# Altium footprint library 7-Connectors-12.PcbLib: 76 footprints (part 4 of 5) (continued)
## SAMTEC_CCH-J-04_OLD [mm] "4 Positions CCH - Bull's Eye Low Cost High Performance SMA Test Point" (continued)
Mechanical 15:
  lines w0.05: -8.505,-3.425 -9.906,-3.425 cw(c-9.906,0) -9.906,3.425 -8.505,3.425 ; -8.501,-3.427 ccw(c-6.604,-2.159) -4.707,-3.427 ; -8.501,3.427 cw(c-6.604,2.159) -4.707,3.427 ; -4.703,-3.425 4.703,-3.425 ; -4.703,3.425 4.703,3.425 ; 4.707,-3.427 ccw(c6.604,-2.159) 8.501,-3.427 ; 4.707,3.427 cw(c6.604,2.159) 8.501,3.427 ; 8.505,-3.425 9.906,-3.425 ccw(c9.906,0) 9.906,3.425 8.505,3.425
Drill Drawing:
  lines w0.1: -7.8,2.9 -9.9,2.9 -9.9,0.8 ; -3.296,2.9 -3.296,0.8 ; 3.3,2.9 3.3,0.8 ; 7.804,2.9 9.904,2.9 9.904,0.8 ; -9.9,0.8 -10.05,0.95 -9.75,0.95 -9.9,0.8 ; -3.296,0.8 -3.446,0.95 -3.146,0.95 -3.296,0.8 ; 3.3,0.8 3.15,0.95 3.45,0.95 3.3,0.8 ; 9.904,0.8 9.754,0.95 10.054,0.95 9.904,0.8
3D body "SAMTEC_CCH-J-04_Part2.stp": height 3.16, standoff -2.62, extent -7.999,-3.55 7.999,3.554
3D body "SAMTEC_CCH-J-04_Part1.stp": height 7.62, standoff 0, extent -13.081,-4.191 13.081,4.191

## SAMTEC_MHDMR-19-02-H-TH-L-TR [mm] "19 Contacts, Pitch 0.4mm, Right Angle, Mini  HDMI High Speed I/O Receptacle"
height 3.2
pads (23):
  rect 0.24x2.05 smd: 1(3.6,0) 2(3.2,0) 3(2.8,0) 4(2.4,0) 5(2,0) 6(1.6,0) 7(1.2,0) 8(0.8,0) 9(0.4,0) 10(0,0) 11(-0.4,0) 12(-0.8,0) 13(-1.2,0) 14(-1.6,0) 15(-2,0) 16(-2.4,0) 17(-2.8,0) 18(-3.2,0) 19(-3.6,0)
  oval 1.32x1.96 hole 0.62 slot 1.26 at 90 deg: SHIELD(-5.425,-5.281) SHIELD(5.423,-5.281)
  oval 1.22x2.14 hole 0.62 slot 1.44 at 90 deg: SHIELD(-5.425,-0.83) SHIELD(5.423,-0.83)
Top Overlay:
  circle w0.25: c4.425,0.5 r0.125
  lines w0.2: -5.6,-6.5 -5.6,-7.33 5.599,-7.33 5.599,-6.5 ; -5.6,-4 -5.6,-2.2 ; -4.6,0.036 -4.199,0.036 ; -3.904,-5.999 ccw(c-3.905,-5.904) -3.82,-5.947 -3.82,-5.937 -3.594,-3.459 cw(c-3.485,-3.474) -3.58,-3.42 cw(c-3.417,-3.562) -3.416,-3.345 -2.814,-3.345 cw(c-2.813,-3.562) -2.65,-3.42 cw(c-2.745,-3.474) -2.636,-3.459 ; -2.636,-3.46 -2.481,-5.473 -2.481,-5.905 ccw(c-2.387,-5.905) -2.4,-5.998 ; 2.322,-5.999 ccw(c2.322,-5.904) 2.407,-5.947 2.407,-5.937 2.633,-3.459 cw(c2.742,-3.474) 2.646,-3.42 cw(c2.81,-3.562) 2.811,-3.345 3.412,-3.345 cw(c3.413,-3.562) 3.577,-3.42 cw(c3.482,-3.474) 3.59,-3.459 ; 3.59,-3.46 3.746,-5.473 3.746,-5.905 ccw(c3.84,-5.905) 3.827,-5.998 ; 4.201,0.036 4.6,0.036 ; 5.599,-4 5.599,-2.2 ; -4.006,-5.897 ccw(c-3.912,-5.905) -3.912,-5.999 -2.316,-5.999 ccw(c-2.316,-5.905) -2.222,-5.897 -2.468,-3.093 ccw(c-2.57,-3.102) -2.57,-2.999 -3.658,-2.999 ccw(c-3.658,-3.102) -3.761,-3.093 -4.006,-5.897 ; 2.221,-5.897 ccw(c2.314,-5.905) 2.314,-5.999 3.911,-5.999 ccw(c3.911,-5.905) 4.004,-5.897 3.759,-3.093 ccw(c3.657,-3.102) 3.657,-2.999 2.568,-2.999 ccw(c2.568,-3.102) 2.466,-3.093 2.221,-5.897
Mechanical 7:
  lines w0.1: -3.699,-0.719 -3.699,-0.71
Mechanical 8:
  lines w0.1: -5.925,-5.68 -5.425,-5.68 -4.925,-5.68 ; -5.925,-5.281 -5.425,-5.281 -4.925,-5.281 ; -5.925,-4.88 -5.425,-4.88 -4.925,-4.88 ; -5.925,-1.28 -5.425,-1.28 -4.925,-1.28 ; -5.925,-0.83 -5.425,-0.83 -4.925,-0.83 ; -5.925,-0.38 -5.425,-0.38 -4.925,-0.38 ; -5.425,-6.18 -5.425,-4.38 ; -5.425,-1.78 -5.425,0.12 ; -4.1,0 -3.6,0 ; -3.6,-0.5 -3.6,0 ; -3.6,0.5 -3.6,0 ; -3.2,-0.5 -3.2,0 ; -3.2,0.5 -3.2,0 ; -2.8,-0.5 -2.8,0 ; -2.8,0.5 -2.8,0 ; -2.4,-0.5 -2.4,0 ; -2.4,0.5 -2.4,0 ; -2,-0.5 -2,0 ; -2,0.5 -2,0 ; -1.6,-0.5 -1.6,0 ; -1.6,0.5 -1.6,0 ; -1.2,-0.5 -1.2,0 ; -1.2,0.5 -1.2,0 ; -0.8,-0.5 -0.8,0 ; -0.8,0.5 -0.8,0 ; -0.4,-0.5 -0.4,0 ; -0.4,0.5 -0.4,0 ; 0,-0.5 0,0 ; 0,0.5 0,0 ; 0.4,-0.5 0.4,0 ; 0.4,0.5 0.4,0 ; 0.8,-0.5 0.8,0 ; 0.8,0.5 0.8,0 ; 1.2,-0.5 1.2,0 ; 1.2,0.5 1.2,0 ; 1.6,-0.5 1.6,0 ; 1.6,0.5 1.6,0 ; 2,-0.5 2,0 ; 2,0.5 2,0 ; 2.4,-0.5 2.4,0 ; 2.4,0.5 2.4,0 ; 2.8,-0.5 2.8,0 ; 2.8,0.5 2.8,0 ; 3.2,-0.5 3.2,0 ; 3.2,0.5 3.2,0 ; 3.6,-0.5 3.6,0 ; 3.6,0.5 3.6,0 ; 4.1,0 3.6,0 ; 4.923,-5.281 5.423,-5.281 5.923,-5.281 ; 4.923,-0.83 5.423,-0.83 5.923,-0.83 ; 4.925,-5.68 5.425,-5.68 5.925,-5.68 ; 4.925,-4.88 5.425,-4.88 5.925,-4.88 ; 4.925,-1.28 5.425,-1.28 5.925,-1.28 ; 4.925,-0.38 5.425,-0.38 5.925,-0.38 ; 5.425,-6.18 5.425,-4.38 ; 5.425,-1.78 5.425,0.12 ; -3.6,0 -3.2,0 ; -3.2,0 -2.8,0 ; -2.8,0 -2.4,0 ; -2.4,0 -2,0 ; -2,0 -1.6,0 ; -1.6,0 -1.2,0 ; -1.2,0 -0.8,0 ; -0.8,0 -0.4,0 ; -0.4,0 0,0 ; 0,0 0.4,0 ; 0.4,0 0.8,0 ; 0.8,0 1.2,0 ; 1.2,0 1.6,0 ; 1.6,0 2,0 ; 2,0 2.4,0 ; 2.4,0 2.8,0 ; 2.8,0 3.2,0 ; 3.2,0 3.6,0
Mechanical 14:
  circle w0.1: c4.425,0.5 r0.2
  lines w0.1: -5.345,-0.33 -5.345,0.036 5.343,0.036 5.343,-0.33 ; -3.904,-5.999 ccw(c-3.905,-5.904) -3.82,-5.947 -3.82,-5.937 -3.594,-3.459 cw(c-3.485,-3.474) -3.58,-3.42 cw(c-3.417,-3.562) -3.416,-3.345 -2.814,-3.345 cw(c-2.813,-3.562) -2.65,-3.42 cw(c-2.745,-3.474) -2.636,-3.459 ; -3.699,0.036 -3.699,0.871 -3.499,0.871 -3.499,0.036 ; -3.449,-0.33 -3.449,-1.031 ccw(c-3.149,-1.031) -2.849,-1.031 -2.849,-0.33 ; -3.299,0.036 -3.299,0.871 -3.099,0.871 -3.099,0.036 ; -2.899,0.036 -2.899,0.871 -2.699,0.871 -2.699,0.036 ; -2.636,-3.46 -2.481,-5.473 -2.481,-5.905 ccw(c-2.387,-5.905) -2.4,-5.998 ; -2.499,0.036 -2.499,0.871 -2.299,0.871 -2.299,0.036 ; -2.099,0.036 -2.099,0.871 -1.899,0.871 -1.899,0.036 ; -1.699,0.036 -1.699,0.871 -1.499,0.871 -1.499,0.036 ; -1.299,0.036 -1.299,0.871 -1.099,0.871 -1.099,0.036 ; -0.899,0.036 -0.899,0.871 -0.699,0.871 -0.699,0.036 ; -0.501,-0.783 0.499,-0.783 ; -0.501,-0.651 0.499,-0.651 ; -0.499,-0.614 -0.499,-1.531 0.499,-1.531 0.501,-0.614 ; -0.499,0.036 -0.499,0.871 -0.299,0.871 -0.299,0.036 ; -0.099,0.036 -0.099,0.871 0.101,0.871 0.101,0.036 ; 0.301,0.036 0.301,0.871 0.501,0.871 0.501,0.036 ; 0.701,0.036 0.701,0.871 0.901,0.871 0.901,0.036 ; 1.101,0.036 1.101,0.871 1.301,0.871 1.301,0.036 ; 1.501,0.036 1.501,0.871 1.701,0.871 1.701,0.036 ; 1.901,0.036 1.901,0.871 2.101,0.871 2.101,0.036 ; 2.301,0.036 2.301,0.871 2.501,0.871 2.501,0.036 ; 2.322,-5.999 ccw(c2.322,-5.904) 2.407,-5.947 2.407,-5.937 2.633,-3.459 cw(c2.742,-3.474) 2.646,-3.42 cw(c2.81,-3.562) 2.811,-3.345 3.412,-3.345 cw(c3.413,-3.562) 3.577,-3.42 cw(c3.482,-3.474) 3.59,-3.459 ; 2.701,0.036 2.701,0.871 2.901,0.871 2.901,0.036 ; 2.848,-0.33 2.848,-1.031 ccw(c3.148,-1.031) 3.447,-1.031 3.447,-0.33 ; 3.101,0.036 3.101,0.871 3.301,0.871 3.301,0.036 ; 3.501,0.036 3.501,0.871 3.701,0.871 3.701,0.036 ; 3.59,-3.46 3.746,-5.473 3.746,-5.905 ccw(c3.84,-5.905) 3.827,-5.998 ; -5.6,-7.33 5.599,-7.33 5.599,-0.33 -5.6,-0.33 -5.6,-7.33 ; -5.576,-5.755 -4.598,-5.755 -4.598,-4.104 -5.576,-4.104 -5.576,-5.755 ; -4.006,-5.897 ccw(c-3.912,-5.905) -3.912,-5.999 -2.316,-5.999 ccw(c-2.316,-5.905) -2.222,-5.897 -2.468,-3.093 ccw(c-2.57,-3.102) -2.57,-2.999 -3.658,-2.999 ccw(c-3.658,-3.102) -3.761,-3.093 -4.006,-5.897 ; 2.221,-5.897 ccw(c2.314,-5.905) 2.314,-5.999 3.911,-5.999 ccw(c3.911,-5.905) 4.004,-5.897 3.759,-3.093 ccw(c3.657,-3.102) 3.657,-2.999 2.568,-2.999 ccw(c2.568,-3.102) 2.466,-3.093 2.221,-5.897 ; 4.597,-5.755 5.575,-5.755 5.575,-4.104 4.597,-4.104 4.597,-5.755
3D body "SAMTEC_MHDMR-19-02-H-TH-L-TR.stp": height 3.28, standoff -0.92, extent -5.74,-7.33 5.738,0.871

## SAMTEC_USB3-B-S-F-TH [mm] "Right Angle, Shielded USB 3.0 Standard B Receptacle"
height 12.9
pads (11):
  round 1.6 hole 0.9: 1(1.25,1) 2(-1.25,1) 3(-1.25,-1) 4(1.25,-1)
  round 1.4 hole 0.7: 5(-4.25,3) 6(-2.5,3) 7(0,3) 8(2.5,3) 9(4.25,3)
  round 3 hole 2.3: SH(-6.02,-3.71) SH(6.02,-3.71)
Top Overlay:
  lines w0.2: -6,-5.61 -6,-13.415 ; -6,-1.81 -6,4.235 6,4.235 6,-1.81 ; -6,3.935 -4.829,3.935 ; -5.7,-13.415 ccw(c-5.4,-13.415) -5.4,-13.715 -3.45,-13.715 ; -5.5,3.935 -5.5,4.235 ; -5.4,-13.415 -5.4,-5.506 ; -5.4,-1.914 -5.4,3.935 ; -5.2,-13.715 -5.2,-13.415 -6,-13.415 ; -2.9,-14.015 -5.4,-14.015 cw(c-5.4,-13.415) -6,-13.415 ; -2.9,-13.953 ccw(c-2.619,-13.932) -2.6,-14.213 ; -2.9,-13.79 2.9,-13.785 ; -2.9,-13.714 -3.45,-13.715 ; -2.9,-13.635 2.9,-13.635 ; 2.6,-14.213 ccw(c2.619,-13.932) 2.9,-13.953 ; 2.9,-14.015 5.4,-14.015 ccw(c5.4,-13.415) 6,-13.415 ; 2.9,-13.714 3.45,-13.715 ; 4.829,3.935 6,3.935 ; 5.19,-13.715 5.2,-13.415 6,-13.415 ; 5.4,-13.415 5.4,-5.506 ; 5.4,-1.914 5.4,3.935 ; 5.5,3.935 5.5,4.235 ; 5.7,-13.415 cw(c5.4,-13.415) 5.4,-13.715 3.45,-13.715 ; 6,-5.61 6,-13.415 ; -3.45,-13.715 ccw(c-3.45,-13.565) -3.3,-13.565 cw(c-3.15,-13.565) -3.15,-13.415 -3.05,-13.415 cw(c-3.05,-13.565) -2.9,-13.565 -2.9,-14.103 ccw(c-2.619,-14.082) -2.6,-14.363 ; -2.6,-14.363 2.6,-14.363 ; -2.6,-14.363 -2.6,-14.213 ; -2.6,-14.213 2.6,-14.214 2.6,-14.363 ; 2.6,-14.363 ccw(c2.619,-14.082) 2.9,-14.103 2.9,-13.953 ; 2.9,-13.953 2.9,-13.565 cw(c3.05,-13.565) 3.05,-13.415 3.15,-13.415 cw(c3.15,-13.565) 3.3,-13.565 ccw(c3.45,-13.565) 3.45,-13.715
Mechanical 8:
  lines w0.1: -6.52,-3.71 -6.02,-3.71 ; -6.02,-4.21 -6.02,-3.71 ; -6.02,-3.21 -6.02,-3.71 ; -5.52,-3.71 -6.02,-3.71 ; -4.75,3 -4.25,3 ; -4.25,2.5 -4.25,3 ; -4.25,3.5 -4.25,3 ; -3.75,3 -4.25,3 ; -3,3 -2.5,3 ; -2.5,2.5 -2.5,3 ; -2.5,3.5 -2.5,3 ; -2,3 -2.5,3 ; -1.75,-1 -1.25,-1 ; -1.75,1 -1.25,1 ; -1.25,-1.5 -1.25,-1 ; -1.25,-0.5 -1.25,-1 ; -1.25,0.5 -1.25,1 ; -1.25,1.5 -1.25,1 ; -0.75,-1 -1.25,-1 ; -0.75,1 -1.25,1 ; -0.5,0 0,0 ; -0.5,3 0,3 ; 0,-0.5 0,0 ; 0,0.5 0,0 ; 0,2.5 0,3 ; 0,3.5 0,3 ; 0.5,0 0,0 ; 0.5,3 0,3 ; 0.75,-1 1.25,-1 ; 0.75,1 1.25,1 ; 1.25,-1.5 1.25,-1 ; 1.25,-0.5 1.25,-1 ; 1.25,0.5 1.25,1 ; 1.25,1.5 1.25,1 ; 1.75,-1 1.25,-1 ; 1.75,1 1.25,1 ; 2,3 2.5,3 ; 2.5,2.5 2.5,3 ; 2.5,3.5 2.5,3 ; 3,3 2.5,3 ; 3.75,3 4.25,3 ; 4.25,2.5 4.25,3 ; 4.25,3.5 4.25,3 ; 4.75,3 4.25,3 ; 5.52,-3.71 6.02,-3.71 ; 6.02,-4.21 6.02,-3.71 ; 6.02,-3.21 6.02,-3.71 ; 6.52,-3.71 6.02,-3.71
Mechanical 14:
  lines w0.1: -6,-5.015 ccw(c-6.093,-5.018) -6.026,-4.953 -7.201,-4.348 -7.252,-4.326 -7.252,-3.104 -7.201,-3.082 ; -6,-2.415 cw(c-6.093,-2.412) -6.026,-2.477 ; -6,3.935 6,3.935 ; -5.7,-13.415 ccw(c-5.4,-13.415) -5.4,-13.715 -3.45,-13.715 ; -5.5,3.935 -5.5,4.235 ; -5.4,-13.415 -5.4,3.935 ; -5.2,-13.715 -5.2,-13.415 -6,-13.415 ; -3.8,3.935 -3.8,4.235 ; -3.5,3.935 -3.5,4.235 ; -2.9,-14.015 -5.4,-14.015 cw(c-5.4,-13.415) -6,-13.415 ; -2.9,-13.953 ccw(c-2.619,-13.932) -2.6,-14.213 ; -2.9,-13.79 2.9,-13.785 ; -2.9,-13.714 -3.45,-13.715 ; -2.9,-13.635 2.9,-13.635 ; 2.6,-14.213 ccw(c2.619,-13.932) 2.9,-13.953 ; 2.9,-14.015 5.4,-14.015 ccw(c5.4,-13.415) 6,-13.415 ; 2.9,-13.714 3.45,-13.715 ; 3.5,3.935 3.5,4.235 ; 3.8,3.935 3.8,4.235 ; 5.19,-13.715 5.2,-13.415 6,-13.415 ; 5.4,-13.415 5.4,3.935 ; 5.5,3.935 5.5,4.235 ; 5.7,-13.415 cw(c5.4,-13.415) 5.4,-13.715 3.45,-13.715 ; 6,-5.015 cw(c6.093,-5.018) 6.026,-4.953 7.201,-4.348 7.252,-4.326 7.252,-3.104 7.201,-3.082 ; 6,-2.415 ccw(c6.093,-2.412) 6.026,-2.477 ; -7.201,-3.082 -6.026,-2.477 ; -7.201,-3.082 -6.026,-2.477 ; -6,-13.415 -6,4.235 6,4.235 6,-13.415 ; -3.45,-13.715 ccw(c-3.45,-13.565) -3.3,-13.565 cw(c-3.15,-13.565) -3.15,-13.415 -3.05,-13.415 cw(c-3.05,-13.565) -2.9,-13.565 -2.9,-14.103 ccw(c-2.619,-14.082) -2.6,-14.363 ; -2.6,-14.363 2.6,-14.363 ; -2.6,-14.363 -2.6,-14.213 ; -2.6,-14.213 2.6,-14.214 2.6,-14.363 ; 2.6,-14.363 ccw(c2.619,-14.082) 2.9,-14.103 2.9,-13.953 ; 2.9,-13.953 2.9,-13.565 cw(c3.05,-13.565) 3.05,-13.415 3.15,-13.415 cw(c3.15,-13.565) 3.3,-13.565 ccw(c3.45,-13.565) 3.45,-13.715 ; 6.026,-2.477 7.201,-3.082 ; 6.026,-2.477 7.201,-3.082
3D body "SAMTEC_USB3-B-S-F-TH.stp": height 13.19, standoff -3.04, extent -7.252,-14.363 7.252,4.235

## TP [mm]
height 11.7
pads (1):
  round 2 smd mask+1: W(0,0)
Top Overlay:
  circle w0.254: c0,0 r2.195
Keep-Out Layer:
  circle w0.025: c0,0 r2.017
3D body "1_016-1_016-3_tp.stp": height 0.02, standoff 0, extent -1.5,-1.5 1.5,1.5

## TYCO_5-6605308-1 [mm] "1 Port, Yellow/Green LEDs, RJ45 10/100Base-T Ethernet, Mag45 Connector Module With Integrated Magnetics"
height 15.24
pads (16):
  oct 1.6x1.6 hole 0.9: 1(-4.445,-1.27)
  round 1.6 hole 0.9: 2(-3.175,1.27) 3(-1.905,-1.27) 4(-0.635,1.27) 5(0.635,-1.27) 6(1.905,1.27) 7(3.175,-1.27) 8(4.445,1.27)
  round 2.3 hole 1.6: 9(-7.747,-4.572) 10(7.747,-4.572)
  round 1.7 hole 1: D1(-6.325,-12.522) D2(-3.785,-10.998) D3(6.325,-10.998) D4(3.785,-12.522)
  round 1 hole 3.2 unplated mask+1.1: M1(-5.715,-7.62) M2(5.715,-7.62)
Top Overlay:
  lines w0.2: -8.191,-6.057 -8.191,-12.07 -7.937,-12.07 -7.937,-18.42 7.938,-18.42 7.938,-12.07 8.192,-12.07 8.192,-6.057 ; -7.937,-18.352 cw(c-7.683,-17.912) -8.046,-18.268 cw(c-5.783,-16.047) -7.937,-13.721 ; -7.937,-18.013 cw(c-5.783,-16.047) -7.937,-14.082 ; -7.175,-3.053 -7.175,2.408 ; -7.175,-0.64 -7.429,-0.64 -7.429,2.408 7.43,2.408 7.43,-0.64 7.176,-0.64 ; -6.871,-13.647 -6.871,-18.166 -4.077,-18.166 -4.077,-12.705 -4.458,-12.705 -4.458,-17.607 -6.49,-17.607 -6.49,-13.761 ; -6.49,-13.88 -4.458,-13.88 ; -6.242,-18.43 ccw(c-5.296,-15.855) -4.35,-18.43 ; 4.077,-13.738 4.077,-18.166 6.871,-18.166 6.871,-12.705 6.49,-12.705 6.49,-17.607 4.458,-17.607 4.458,-13.576 ; 4.35,-18.43 ccw(c5.296,-15.855) 6.242,-18.43 ; 4.458,-13.88 6.49,-13.88 ; 7.176,-3.053 7.176,2.408 ; 7.938,-18.352 ccw(c7.684,-17.912) 8.046,-18.268 ccw(c5.783,-16.047) 7.938,-13.721 ; 7.938,-18.013 ccw(c5.783,-16.047) 7.938,-14.082
Mechanical 8:
  circle w0.1: c-7.747,-4.572 r0.8
  circle w0.1: c7.747,-4.572 r0.8
  circle w0.1: c-5.715,-7.62 r1.6
  circle w0.1: c5.715,-7.62 r1.6
  circle w0.1: c-6.325,-12.522 r0.5
  circle w0.1: c-3.785,-10.998 r0.5
  circle w0.1: c3.785,-12.522 r0.5
  circle w0.1: c6.325,-10.998 r0.5
  circle w0.1: c-3.175,1.27 r0.45
  circle w0.1: c-4.445,-1.27 r0.45
  circle w0.1: c-1.905,-1.27 r0.45
  circle w0.1: c0.635,-1.27 r0.45
  circle w0.1: c3.175,-1.27 r0.45
  circle w0.1: c4.445,1.27 r0.45
  circle w0.1: c1.905,1.27 r0.45
  circle w0.1: c-0.635,1.27 r0.45
  lines w0.1: -9.2,-14.529 9.2,-14.529 ; -8.247,-4.572 -7.747,-4.572 ; -7.747,-5.072 -7.747,-4.572 ; -7.747,-4.072 -7.747,-4.572 ; -7.247,-4.572 -7.747,-4.572 ; -6.825,-12.522 -6.325,-12.522 ; -6.325,-13.022 -6.325,-12.522 ; -6.325,-12.022 -6.325,-12.522 ; -6.215,-7.62 -5.715,-7.62 ; -5.825,-12.522 -6.325,-12.522 ; -5.715,-8.12 -5.715,-7.62 ; -5.715,-7.12 -5.715,-7.62 ; -5.215,-7.62 -5.715,-7.62 ; -4.945,-1.27 -4.445,-1.27 ; -4.445,-1.77 -4.445,-1.27 ; -4.445,-0.77 -4.445,-1.27 ; -4.285,-10.998 -3.785,-10.998 ; -3.945,-1.27 -4.445,-1.27 ; -3.785,-11.498 -3.785,-10.998 ; -3.785,-10.498 -3.785,-10.998 ; -3.675,1.27 -3.175,1.27 ; -3.285,-10.998 -3.785,-10.998 ; -3.175,0.77 -3.175,1.27 ; -3.175,1.77 -3.175,1.27 ; -2.675,1.27 -3.175,1.27 ; -2.405,-1.27 -1.905,-1.27 ; -1.905,-1.77 -1.905,-1.27 ; -1.905,-0.77 -1.905,-1.27 ; -1.405,-1.27 -1.905,-1.27 ; -1.135,1.27 -0.635,1.27 ; -0.635,0.77 -0.635,1.27 ; -0.635,1.77 -0.635,1.27 ; -0.5,0 0,0 ; -0.135,1.27 -0.635,1.27 ; 0,-0.5 0,0 ; 0,0.5 0,0 ; 0.135,-1.27 0.635,-1.27 ; 0.5,0 0,0 ; 0.635,-1.77 0.635,-1.27 ; 0.635,-0.77 0.635,-1.27 ; 1.135,-1.27 0.635,-1.27 ; 1.405,1.27 1.905,1.27 ; 1.905,0.77 1.905,1.27 ; 1.905,1.77 1.905,1.27 ; 2.405,1.27 1.905,1.27 ; 2.675,-1.27 3.175,-1.27 ; 3.175,-1.77 3.175,-1.27 ; 3.175,-0.77 3.175,-1.27 ; 3.285,-12.522 3.785,-12.522 ; 3.675,-1.27 3.175,-1.27 ; 3.785,-13.022 3.785,-12.522 ; 3.785,-12.022 3.785,-12.522 ; 3.945,1.27 4.445,1.27 ; 4.285,-12.522 3.785,-12.522 ; 4.445,0.77 4.445,1.27 ; 4.445,1.77 4.445,1.27 ; 4.945,1.27 4.445,1.27 ; 5.215,-7.62 5.715,-7.62 ; 5.715,-8.12 5.715,-7.62 ; 5.715,-7.12 5.715,-7.62 ; 5.825,-10.998 6.325,-10.998 ; 6.215,-7.62 5.715,-7.62 ; 6.325,-11.498 6.325,-10.998 ; 6.325,-10.498 6.325,-10.998 ; 6.825,-10.998 6.325,-10.998 ; 7.247,-4.572 7.747,-4.572 ; 7.747,-5.072 7.747,-4.572 ; 7.747,-4.072 7.747,-4.572 ; 8.247,-4.572 7.747,-4.572
Mechanical 14:
  lines w0.1: -7.937,-18.352 cw(c-7.683,-17.912) -8.046,-18.268 cw(c-5.783,-16.047) -7.937,-13.721 ; -7.937,-18.013 cw(c-5.783,-16.047) -7.937,-14.082 ; -7.175,-0.64 -7.429,-0.64 -7.429,2.408 7.43,2.408 7.43,-0.64 7.176,-0.64 ; -7.175,2.408 -7.175,-3.053 -7.937,-3.053 -7.937,-4.45 -8.191,-4.45 -8.191,-12.07 -7.937,-12.07 -7.937,-18.42 7.938,-18.42 7.938,-12.07 8.192,-12.07 8.192,-4.45 7.938,-4.45 7.938,-3.053 7.176,-3.053 7.176,2.408 ; -6.49,-13.88 -4.458,-13.88 ; -6.242,-18.43 ccw(c-5.296,-15.855) -4.35,-18.43 ; 4.35,-18.43 ccw(c5.296,-15.855) 6.242,-18.43 ; 4.458,-13.88 6.49,-13.88 ; 7.938,-18.352 ccw(c7.684,-17.912) 8.046,-18.268 ccw(c5.783,-16.047) 7.938,-13.721 ; 7.938,-18.013 ccw(c5.783,-16.047) 7.938,-14.082 ; -6.871,-18.166 -4.077,-18.166 -4.077,-12.705 -4.458,-12.705 -4.458,-17.607 -6.49,-17.607 -6.49,-12.705 -6.871,-12.705 -6.871,-18.166 ; 4.077,-18.166 6.871,-18.166 6.871,-12.705 6.49,-12.705 6.49,-17.607 4.458,-17.607 4.458,-12.705 4.077,-12.705 4.077,-18.166
3D body "TYCO_5-6605308-1.stp": height 14.99, standoff -3.68, extent -8.952,-18.598 8.953,2.408
3D body "m20-254via.stp": height 0.1, standoff -1.82, extent -5.295,-2.12 -3.595,-0.42
3D body "m20-254via.stp": height 0.1, standoff -1.82, extent -2.755,-2.12 -1.055,-0.42
3D body "m20-254via.stp": height 0.1, standoff -1.82, extent -0.215,-2.12 1.485,-0.42
3D body "m20-254via.stp": height 0.1, standoff -1.82, extent 2.325,-2.12 4.025,-0.42
3D body "m20-254via.stp": height 0.1, standoff -1.82, extent 3.595,0.42 5.295,2.12
3D body "m20-254via.stp": height 0.1, standoff -1.82, extent 1.055,0.42 2.755,2.12
3D body "m20-254via.stp": height 0.1, standoff -1.82, extent -1.485,0.42 0.215,2.12
3D body "m20-254via.stp": height 0.1, standoff -1.82, extent -4.025,0.42 -2.325,2.12
3D body "m20-254via.stp": height 0.1, standoff -1.82, extent -7.174,-13.372 -5.474,-11.672
3D body "m20-254via.stp": height 0.1, standoff -1.82, extent -4.635,-11.823 -2.934,-10.123
3D body "m20-254via.stp": height 0.1, standoff -1.82, extent 2.935,-13.372 4.635,-11.672
3D body "m20-254via.stp": height 0.1, standoff -1.82, extent 5.475,-11.848 7.175,-10.148
3D body "rj45-gdvia.stp": height 0.1, standoff -1.85, extent -8.897,-5.722 -6.597,-3.422
3D body "rj45-gdvia.stp": height 0.1, standoff -1.85, extent 6.597,-5.722 8.897,-3.422

## TYCO_1367073-1 [mm] "20 Position, Pitch 0.8mm SFP Receptacle (Small Form-factor Pluggable)"
height 5.4
pads (22):
  rect 2x0.5 smd: 1(-4.1,3.395) 2(-4.1,2.595) 3(-4.1,1.795) 4(-4.1,0.995) 5(-4.1,0.195) 6(-4.1,-0.605) 7(-4.1,-1.405) 8(-4.1,-2.205) 9(-4.1,-3.005) 10(-4.1,-3.805) 11(4.1,-3.405) 12(4.1,-2.605) 13(4.1,-1.805) 14(4.1,-1.005) 15(4.1,-0.205) 16(4.1,0.595) 17(4.1,1.395) 18(4.1,2.195) 19(4.1,2.995) 20(4.1,3.795)
  round 1 hole 1.55 unplated mask+0.28: MTG1(0,4.795) MTG2(0,-4.805)
Top Layer keep-out:
  lines w0.1: -4.34,-5.755 -4.34,-4.395 -2.88,-4.395 -2.88,-3.855 2.88,-3.855 2.88,-3.995 3.94,-3.995 3.94,-4.805 3.94,-5.755 -4.34,-5.755 ; -4.34,3.985 -4.34,5.745 3.94,5.745 3.94,4.385 2.88,4.385 2.88,3.845 -2.88,3.845 -2.88,3.985 -4.34,3.985
Top Overlay:
  circle w0.25: c-4.955,4.318 r0.125
  lines w0.2: -40,-7.774 -42.4,-7.774 -42.4,7.774 -40,7.774 ; -4,-4.505 -4,-5.505 -0.944,-5.505 ; -3.7,-5.505 -3.7,-4.505 ; -3.7,-5.305 -2.98,-4.705 -2.98,-4.505 ; -3.7,4.045 -3.7,5.495 ; -3.7,4.095 -4,4.095 -4,5.495 -0.944,5.495 ; -3.7,4.432 -2.98,4.495 ; -3.7,5.295 -2.98,4.695 -2.98,4.045 ; -3.223,4.045 -3.223,4.474 ; 0.944,-5.505 2.9,-5.505 3.7,-4.705 3.7,-4.055 ; 0.944,5.495 3.7,5.495 3.7,4.445 ; 5.5,-7.774 6.3,-7.774 6.3,-5.777 ; 5.5,7.774 6.3,7.774 6.3,5.777
Mechanical 8:
  circle w0.1: c0,-4.805 r0.775
  circle w0.1: c0,4.795 r0.775
  lines w0.1: -4.6,-3.805 -4.1,-3.805 -3.6,-3.805 ; -4.6,-3.005 -4.1,-3.005 -3.6,-3.005 ; -4.6,-2.205 -4.1,-2.205 -3.6,-2.205 ; -4.6,-1.405 -4.1,-1.405 -3.6,-1.405 ; -4.6,-0.605 -4.1,-0.605 -3.6,-0.605 ; -4.6,0.195 -4.1,0.195 -3.6,0.195 ; -4.6,0.995 -4.1,0.995 -3.6,0.995 ; -4.6,1.795 -4.1,1.795 -3.6,1.795 ; -4.6,2.595 -4.1,2.595 -3.6,2.595 ; -4.6,3.395 -4.1,3.395 -3.6,3.395 ; -4.1,-4.305 -4.1,3.895 ; -0.5,-4.805 0,-4.805 ; -0.5,0 0,0 ; -0.5,4.795 0,4.795 ; 0,-5.305 0,-4.805 ; 0,-4.305 0,-4.805 ; 0,-0.5 0,0 ; 0,0.5 0,0 ; 0,4.295 0,4.795 ; 0,5.295 0,4.795 ; 0.5,-4.805 0,-4.805 ; 0.5,0 0,0 ; 0.5,4.795 0,4.795 ; 3.6,-3.405 4.1,-3.405 4.6,-3.405 ; 3.6,-2.605 4.1,-2.605 4.6,-2.605 ; 3.6,-1.805 4.1,-1.805 4.6,-1.805 ; 3.6,-1.005 4.1,-1.005 4.6,-1.005 ; 3.6,-0.205 4.1,-0.205 4.6,-0.205 ; 3.6,0.595 4.1,0.595 4.6,0.595 ; 3.6,1.395 4.1,1.395 4.6,1.395 ; 3.6,2.195 4.1,2.195 4.6,2.195 ; 3.6,2.995 4.1,2.995 4.6,2.995 ; 3.6,3.795 4.1,3.795 4.6,3.795 ; 4.1,-3.905 4.1,4.295
Mechanical 14:
  circle w0.1: c-4.955,4.318 r0.125
  lines w0.1: -3.7,-5.505 -3.7,-4.105 ; -3.7,-5.305 -2.98,-4.705 -2.98,-4.505 ; -3.7,-4.442 -2.98,-4.505 ; -3.7,-4.055 -5.1,-4.055 -5.1,-3.555 -3.7,-3.555 ; -3.7,-3.255 -5.1,-3.255 -5.1,-2.755 -3.7,-2.755 ; -3.7,-2.455 -5.1,-2.455 -5.1,-1.955 -3.7,-1.955 ; -3.7,-1.655 -5.1,-1.655 -5.1,-1.155 -3.7,-1.155 ; -3.7,-0.855 -5.1,-0.855 -5.1,-0.355 -3.7,-0.355 ; -3.7,-0.055 -5.1,-0.055 -5.1,0.445 -3.7,0.445 ; -3.7,0.745 -5.1,0.745 -5.1,1.245 -3.7,1.245 ; -3.7,1.545 -5.1,1.545 -5.1,2.045 -3.7,2.045 ; -3.7,2.345 -5.1,2.345 -5.1,2.845 -3.7,2.845 ; -3.7,3.145 -5.1,3.145 -5.1,3.645 -3.7,3.645 ; -3.7,4.432 -2.98,4.495 ; -3.7,5.295 -2.985,4.695 -2.98,4.695 -2.98,4.495 ; -3.7,5.495 -3.7,4.095 ; -3.223,-4.484 -3.223,4.474 ; 3.7,-3.655 5.1,-3.655 5.1,-3.155 3.7,-3.155 ; 3.7,-2.855 5.1,-2.855 5.1,-2.355 3.7,-2.355 ; 3.7,-2.055 5.1,-2.055 5.1,-1.555 3.7,-1.555 ; 3.7,-1.255 5.1,-1.255 5.1,-0.755 3.7,-0.755 ; 3.7,-0.455 5.1,-0.455 5.1,0.045 3.7,0.045 ; 3.7,0.345 5.1,0.345 5.1,0.845 3.7,0.845 ; 3.7,1.145 5.1,1.145 5.1,1.645 3.7,1.645 ; 3.7,1.945 5.1,1.945 5.1,2.445 3.7,2.445 ; 3.7,2.745 5.1,2.745 5.1,3.245 3.7,3.245 ; 3.7,3.545 5.1,3.545 5.1,4.045 3.7,4.045 ; -3.7,-4.105 -3.7,4.095 ; -3.7,-4.105 -4,-4.105 -4,-5.505 2.9,-5.505 3.7,-4.705 3.7,5.495 -4,5.495 -4,4.095 -3.7,4.095 ; -2.98,-4.505 -2.98,4.495
3D body "TYCO_1367073-1.stp": height 5.22, standoff -0.81, extent -4.5,-5.505 4.5,5.495

## TYCO_1734035-1 [mm] "SMD, Right Angle, 5 Position, Type B, Mini USB Receptacle"
height 3.95
pads (11):
  rect 0.5x2.3 smd: 1(-1.575,0) 2(-0.8,0) 3(0,0) 4(0.8,0) 5(1.6,0)
  rect 2x2.5 smd: 6(-4.45,-5.6) 6(-4.45,-0.1) 6(4.45,-5.6) 6(4.45,-0.1)
  round 0.5 hole 0.9 unplated mask+0.2: MTG1(-2.2,-2.6) MTG2(2.2,-2.6)
Top Overlay:
  lines w0.2: -4.35,-1.7 -3.85,-1.7 ; -4.35,-1.65 -4.35,-1.9 -3.85,-1.9 ; -3.85,-7.15 -3.85,-8.5 3.85,-8.5 3.85,-7.15 ; -3.85,-4.05 -3.85,-1.65 ; -3.15,-8.5 -3.15,0.7 -2.15,0.7 ; -3.15,0 -2.15,0 ; 2.15,0 3.15,0 ; 2.15,0.7 3.15,0.7 3.15,-8.5 ; 3.85,-4.05 3.85,-1.65 ; 3.85,-1.9 4.35,-1.9 4.35,-1.65 ; 3.85,-1.7 4.35,-1.7
Mechanical 8:
  circle w0.1: c-2.2,-2.6 r0.45
  circle w0.1: c2.2,-2.6 r0.45
  lines w0.1: -4.95,-5.6 -4.45,-5.6 ; -4.95,-0.1 -4.45,-0.1 ; -4.45,-7.85 0,-7.85 4.45,-7.85 ; -4.45,-6.1 -4.45,-5.6 ; -4.45,-5.1 -4.45,-5.6 ; -4.45,-0.6 -4.45,-0.1 ; -4.45,0.4 -4.45,-0.1 ; -3.95,-5.6 -4.45,-5.6 ; -3.95,-0.1 -4.45,-0.1 ; -2.7,-2.6 -2.2,-2.6 ; -2.2,-3.1 -2.2,-2.6 ; -2.2,-2.1 -2.2,-2.6 ; -2.1,0 -1.6,0 ; -1.7,-2.6 -2.2,-2.6 ; -1.6,-0.5 -1.6,0 ; -1.6,0.5 -1.6,0 ; -0.8,-0.5 -0.8,0 ; -0.8,0.5 -0.8,0 ; 0,-0.5 0,0 ; 0,0.5 0,0 ; 0.8,-0.5 0.8,0 ; 0.8,0.5 0.8,0 ; 1.6,-0.5 1.6,0 ; 1.6,0.5 1.6,0 ; 1.7,-2.6 2.2,-2.6 ; 2.1,0 1.6,0 ; 2.2,-3.1 2.2,-2.6 ; 2.2,-2.1 2.2,-2.6 ; 2.7,-2.6 2.2,-2.6 ; 3.95,-5.6 4.45,-5.6 ; 3.95,-0.1 4.45,-0.1 ; 4.45,-6.1 4.45,-5.6 ; 4.45,-5.1 4.45,-5.6 ; 4.45,-0.6 4.45,-0.1 ; 4.45,0.4 4.45,-0.1 ; 4.95,-5.6 4.45,-5.6 ; 4.95,-0.1 4.45,-0.1 ; -1.6,0 -0.8,0 ; -0.8,0 0,0 ; 0,0 0.8,0 ; 0.8,0 1.6,0 ; -5.45,-6.85 -5.45,-4.35 -3.45,-4.35 -3.45,-6.85 -5.45,-6.85 ; -5.45,-1.35 -5.45,1.15 -3.45,1.15 -3.45,-1.35 -5.45,-1.35 ; -1.85,-1.15 -1.35,-1.15 -1.35,1.15 -1.85,1.15 -1.85,-1.15 ; -1.05,-1.15 -0.55,-1.15 -0.55,1.15 -1.05,1.15 -1.05,-1.15 ; -0.25,-1.15 0.25,-1.15 0.25,1.15 -0.25,1.15 -0.25,-1.15 ; 0.55,-1.15 1.05,-1.15 1.05,1.15 0.55,1.15 0.55,-1.15 ; 1.35,-1.15 1.85,-1.15 1.85,1.15 1.35,1.15 1.35,-1.15 ; 3.45,-6.85 3.45,-4.35 5.45,-4.35 5.45,-6.85 3.45,-6.85 ; 3.45,-1.35 3.45,1.15 5.45,1.15 5.45,-1.35 3.45,-1.35
Mechanical 14:
  lines w0.1: -4.35,-1.7 -3.85,-1.7 ; -4.35,-0.8 -4.95,-0.8 -4.95,0.7 4.95,0.7 4.95,-0.8 4.35,-0.8 ; -3.85,-6.3 -4.95,-6.3 -4.95,-4.8 -3.85,-4.8 ; -3.85,-1.9 -4.35,-1.9 -4.35,0 cw(c-3.65,0) -3.65,0.7 ; -3.85,0.667 -3.85,0.7 ; -3.15,-8.5 -3.15,0.7 ccw(c-3.15,0) -3.85,0 ; 3.15,-8.5 3.15,0.7 cw(c3.15,0) 3.85,0 ; 3.65,0.7 cw(c3.65,0) 4.35,0 4.35,-1.9 3.85,-1.9 ; 3.85,-6.3 4.95,-6.3 4.95,-4.8 3.85,-4.8 ; 3.85,-1.7 4.35,-1.7 ; 3.85,0.667 3.85,0.7 ; -3.85,0 -3.85,-8.5 3.85,-8.5 3.85,0 ; -3.85,0 3.85,0
3D body "usb-arm0523.stp": height 0, standoff 0, extent 1.35,-1.15 1.85,1.15
3D body "usb-arm0523.stp": height 0, standoff 0, extent 0.55,-1.15 1.05,1.15
3D body "usb-arm0523.stp": height 0, standoff 0, extent -0.25,-1.15 0.25,1.15
3D body "usb-arm0523.stp": height 0, standoff 0, extent -1.05,-1.15 -0.55,1.15
3D body "usb-arm0523.stp": height 0, standoff 0, extent -1.825,-1.15 -1.325,1.15
3D body "usb-arm.stp": height 0, standoff 0, extent 3.445,-6.838 5.445,-4.338
3D body "usb-arm.stp": height 0, standoff 0, extent 3.445,-1.377 5.445,1.123
3D body "usb-arm.stp": height 0, standoff 0, extent -5.445,-1.377 -3.445,1.123
3D body "usb-arm.stp": height 0, standoff 0, extent -5.445,-6.838 -3.445,-4.338
3D body "TYCO_1734035-1.stp": height 4.14, standoff -0.95, extent -4.95,-8.5 4.95,0.7